# Altium footprint library Resistors_SMD_IPC-SM-782.PcbLib: 200 footprints (part 8 of 13)
Each footprint in its own frame and in the unit in brackets; x right, y up, seen from the top. Pads: shape width x height; smd on the part's side, far side on the other; paste and mask are expansions set on the pad; w line width, h text height; cw(c..) or ccw(c..) is an arc to the next point about the centre after c.
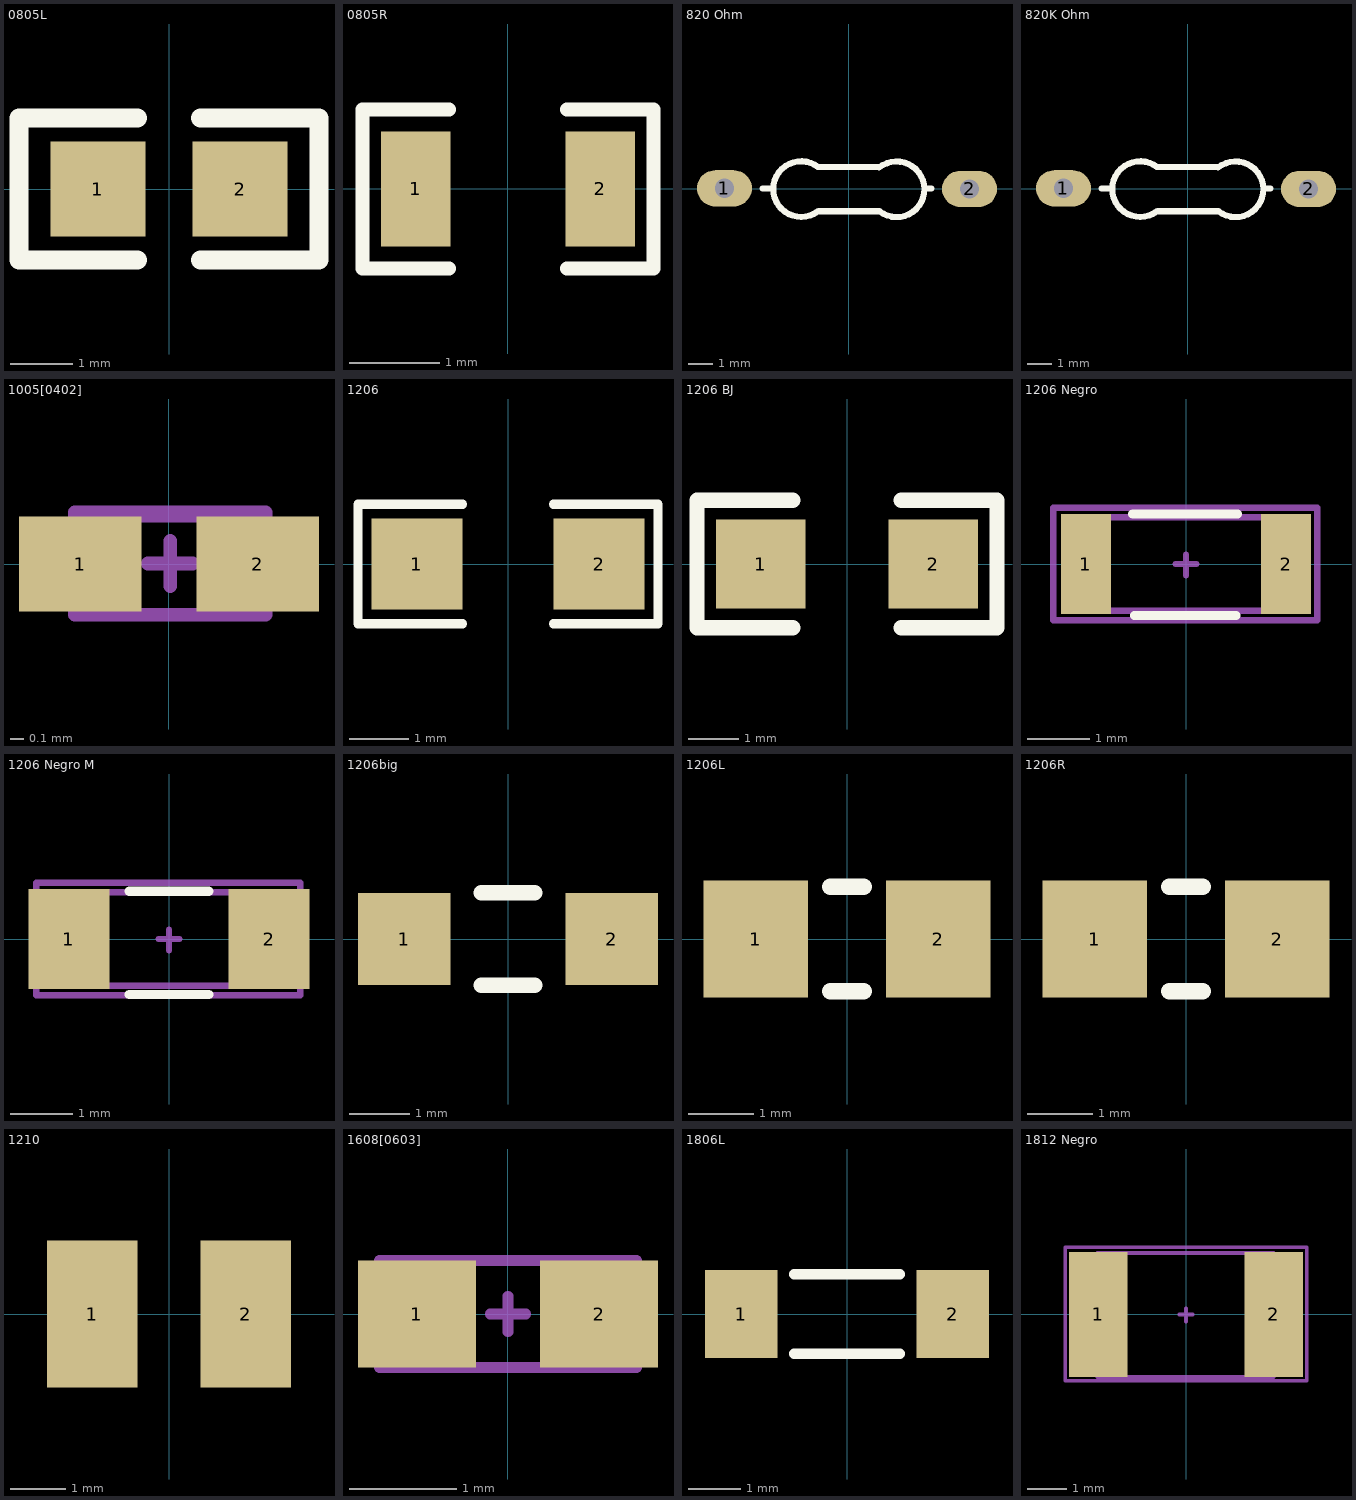
[diagram p7: the footprints below, top view; thin cyan lines are the x and y axes]

## 0805L [mil] "0805 case"
pads (2):
  rect 60x60 smd: 1(-45,0) 2(45,0)
Top Overlay:
  lines w12: -20,-45 -95,-45 -95,45 -20,45 ; 20,-45 95,-45 95,45 20,45
3D body "User Library-ind_0805.step": height 37.4, standoff 0, extent -40,-23.98 38.74,23.27

## 0805R [mil]
pads (2):
  rect 30x50 smd: 1(-40,0) 2(40,0)
Top Overlay:
  lines w6: -25.59,-34.45 -62.99,-34.45 -62.99,34.45 -25.59,34.45 ; 25.59,-34.45 62.99,-34.45 62.99,34.45 25.59,34.45
3D body "R0805.step": height 18.66, standoff 0, extent -40,-25.04 38.74,24.25

## 820 Ohm [mm] "RESISTENCIA DE 1/4 W DE 820 OHM"
pads (2):
  oval 2.27x1.5 hole 0.8: 1(-5.125,0.025) 2(5,0)
Top Overlay:
  lines w0.254: -3.55,0.025 -3.225,0.025 ; -1.269,-0.925 cw(c-1.959,-0.005) -1.25,0.9 ; -1.248,0.9 1.25,0.9 ; -1.245,-0.925 1.286,-0.925 ; 1.265,0.881 cw(c1.985,-0.015) 1.286,-0.928 ; 3.15,0.025 3.425,0.025
3D body "SW3dPS-RESISTOR, 0.25 W, 0.4 IN LEAD PITCH.STEP": height 1.16, standoff -1.16, extent -5.56,-2.349 5.21,3.125
3D body "Res 820.STEP": height 2.93, standoff -0.91, extent -5.385,-1.168 5.385,1.143

## 820K Ohm [mm] "RESISTENCIA DE 1/4 W DE 820K OHM"
pads (2):
  oval 2.27x1.5 hole 0.8: 1(-5.125,0.025) 2(5,0)
Top Overlay:
  lines w0.254: -3.55,0.025 -3.225,0.025 ; -1.269,-0.925 cw(c-1.959,-0.005) -1.25,0.9 ; -1.248,0.9 1.25,0.9 ; -1.245,-0.925 1.286,-0.925 ; 1.265,0.881 cw(c1.985,-0.015) 1.286,-0.928 ; 3.15,0.025 3.425,0.025
3D body "Res 820K.STEP": height 2.93, standoff -0.91, extent -5.385,-1.168 5.385,1.143
3D body "SW3dPS-RESISTOR, 0.25 W, 0.4 IN LEAD PITCH.STEP": height 1.16, standoff -1.16, extent -5.56,-2.349 5.21,3.125

## 1005[0402] [mm] "Chip Resistor; Body 1.1 x 0.5 mm (LxW typ)"
height 0.4
pads (2):
  rect 0.9x0.7 smd: 1(-0.65,0) 2(0.65,0)
Mechanical 15:
  lines w0.1: -0.692,0.354 0.708,0.354 ; -0.157,0.004 0.173,0.004 ; 0.008,-0.161 0.008,0.169 ; -0.692,-0.371 -0.692,0.379 0.708,0.379 0.708,-0.371 -0.692,-0.371
3D body "R_0402.step": height 0.35, standoff 0, extent -0.5,-0.25 0.5,0.25

## 1206 [mil]
pads (2):
  rect 60x60 smd: 1(-60,0) 2(60,0)
Top Overlay:
  lines w6: -30,-39.37 -98.87,-39.37 -98.87,39.37 -30,39.37 ; 30,-39.37 98.87,-39.37 98.87,39.37 30,39.37
3D body "SW3dPS-R1206.step": height 18.66, standoff 0, extent -61.02,-30.55 61.03,30.56

## 1206 BJ [mil]
pads (2):
  rect 70x70 smd paste-1.18 mask+5.5: 1(-67.5,0) 2(67.5,0)
Top Overlay:
  lines w12: -42.5,-50 -117.5,-50 -117.5,50 -42.5,50 ; 42.5,-50 117.5,-50 117.5,50 42.5,50
3D body "SW3dPS-R1206.step": height 18.66, standoff 0, extent -61.02,-31.1 61.02,30

## 1206 Negro [mm] "Chip Resistor, Empaque 1206"
height 0.3
pads (2):
  rect 0.8x1.6 smd: 1(-1.6,0) 2(1.6,0)
Top Overlay:
  lines w0.15: -0.85,0.8 0.825,0.8 ; -0.825,-0.825 0.8,-0.825
Mechanical 13:
  lines w0.1: -1.6,-0.75 -1.6,0.75 1.6,0.75 1.6,-0.75 -1.6,-0.75
Mechanical 15:
  lines w0.1: -0.165,0 0.165,0 ; 0,-0.18 0,0.15 ; -2.125,-0.9 -2.125,0.9 2.1,0.9 2.1,-0.9 -2.125,-0.9
3D body "1206 SMD Resistor.STEP": height 1, standoff 0, extent -1.6,-0.8 1.6,0.8

## 1206 Negro M [mm] "Chip Resistor, Empaque 1206"
height 0.3
pads (2):
  rect 1.3x1.6 smd: 1(-1.6,0) 2(1.6,0)
Top Overlay:
  lines w0.15: -0.635,-0.889 0.635,-0.889 ; -0.635,0.762 0.635,0.762
Mechanical 13:
  lines w0.1: -1.6,-0.75 1.6,-0.75 1.6,0.75 -1.6,0.75 -1.6,-0.75
Mechanical 15:
  lines w0.1: -0.165,0 0.165,0 ; 0,-0.18 0,0.15 ; -2.125,-0.9 2.1,-0.9 2.1,0.9 -2.125,0.9 -2.125,-0.9
3D body "1206 SMD Resistor.STEP": height 1, standoff 0, extent -1.6,-0.8 1.6,0.8

## 1206big [mil] "EDISP100"
pads (2):
  rect 60x60 smd: 1(-67.5,0) 2(67.5,0)
Top Overlay:
  lines w10: -17.5,-30 17.5,-30 ; -17.5,30 17.5,30
3D body "SW3dPS-R1206.step": height 18.66, standoff 0, extent -60,-30 62.05,31.1

## 1206L [mm]
pads (2):
  rect 1.6x1.8 smd: 1(-1.4,0) 2(1.4,0)
Top Overlay:
  lines w0.254: -0.254,-0.8 0.254,-0.8 ; -0.254,0.8 0.254,0.8
3D body "SW3dPS-R1206.step": height 0.47, standoff 0, extent -1.55,-0.79 1.55,0.762

## 1206R [mm]
pads (2):
  rect 1.6x1.8 smd: 1(-1.4,0) 2(1.4,0)
Top Overlay:
  lines w0.254: -0.254,-0.8 0.254,-0.8 ; -0.254,0.8 0.254,0.8
3D body "SW3dPS-R1206.step": height 0.47, standoff 0, extent -1.55,-0.79 1.55,0.762

## 1210 [mil] "1/4W"
pads (2):
  rect 65x105 smd mask+4: 1(-55,0) 2(55,0)
3D body "User Library-Chip Resistor_1210 (3225).step": height 22.24, standoff 0, extent -61.02,-51.44 61.02,51

## 1608[0603] [mm] "Chip Resistor; Body 1.6 x 0.8 mm (LxW typ)"
height 0.6
pads (2):
  rect 1.1x1 smd: 1(-0.85,0) 2(0.85,0)
Mechanical 15:
  lines w0.1: -0.165,0 0.165,0 ; 0,-0.165 0,0.165 ; -1.2,-0.5 -1.2,0.5 1.2,0.5 1.2,-0.5 -1.2,-0.5
3D body "R_0603.step": height 0.5, standoff 0, extent -0.8,-0.45 0.8,0.45

## 1806L [mm]
pads (2):
  rect 1.4x1.7 smd: 1(-2.032,0) 2(2.032,0)
Top Overlay:
  lines w0.203: -1.016,-0.762 1.016,-0.762 ; -1.016,0.762 1.016,0.762
3D body "User Library-Chip Inductor-1806.step": height 1.59, standoff -0.01, extent -2.25,-0.797 2.25,0.803

## 1812 Negro [mm] "Chip Resistor, Empaque 1812"
height 0.3
pads (2):
  rect 1.5x3.2 smd: 1(-2.25,0) 2(2.25,0)
Mechanical 13:
  lines w0.1: -2.275,-1.6 2.25,-1.6 2.25,1.575 -2.275,1.575 -2.275,-1.6
Mechanical 15:
  lines w0.1: -0.165,0 0.165,0 ; 0,-0.18 0,0.15 ; 3.075,1.725 -3.1,1.725 -3.1,-1.7 3.1,-1.7 3.1,1.725
3D body "1812 SMD Resistor.STEP": height 1.6, standoff 0, extent -2.25,-1.6 2.25,1.6